# Altium schematic symbol library jlcpcb_2025_04_capacitors_extended_0603.schlib: 3668 symbols (part 15 of 20) (continued)
## GCJ188R71E153KA01D
designator C?  Capacitance: 15nF  (hidden comment: *)
Capacitor, Ceramic (MLCC), 15nF, ±10%, ±10%, SMD 0603; Manufacturer: Murata Electronics; Manufacturer Part Number: GCJ188R71E153KA01D; Package Size: 0603; JLCPCB Basic Part: No; JLCPCB Part Number: C883603; Supplier 1: LCSC; Category: Capacitors - MLCC; Supplier Part Number 1: C883603; Tolerance: ±10%; RoHS: Yes; ComponentLink1Description: Datasheet; ComponentLink1URL: https://wmsc.lcsc.com/wmsc/upload/file/pdf/v2/lcsc/2304140030_Murata-Electronics-GCJ188R71E153KA01D_C883603.pdf; ComponentLink2Description: JLCPCB Part URL; ComponentLink2URL: https://jlcpcb.com/partdetail/C883603; ComponentLink3Description: LCSC Part URL; ComponentLink3URL: https://lcsc.com/product-detail/Multilayer-Ceramic-Capacitors-MLCC---SMD-SMT_Murata-Electronics-Murata-Electronics-GCJ188R71E153KA01D_C883603.html
footprint CAP-0603 (0603 (1608M) Capacitor)
pins: 1, 2

## GCJ188R71E224KA12D
designator C?  Capacitance: 220nF  (hidden comment: *)
Capacitor, Ceramic (MLCC), 220nF, ±10%, 25V, X7R, ±10%, SMD 0603; Manufacturer: Murata Electronics; Manufacturer Part Number: GCJ188R71E224KA12D; Package Size: 0603; JLCPCB Basic Part: No; JLCPCB Part Number: C441745; Supplier 1: LCSC; Category: Capacitors - MLCC; Supplier Part Number 1: C441745; Tolerance: ±10%; Voltage Rating: 25V; Temperature Coefficient: X7R; RoHS: Yes; ComponentLink1Description: Datasheet; ComponentLink1URL: https://wmsc.lcsc.com/wmsc/upload/file/pdf/v2/lcsc/2304140030_Murata-Electronics-GCJ188R71E224KA12D_C441745.pdf; ComponentLink2Description: JLCPCB Part URL; ComponentLink2URL: https://jlcpcb.com/partdetail/C441745; ComponentLink3Description: LCSC Part URL; ComponentLink3URL: https://lcsc.com/product-detail/Multilayer-Ceramic-Capacitors-MLCC---SMD-SMT_Murata-Electronics-Murata-Electronics-GCJ188R71E224KA12D_C441745.html
footprint CAP-0603 (0603 (1608M) Capacitor)
pins: 1, 2

## GCJ188R71E473KA01D
designator C?  Capacitance: 47nF  (hidden comment: *)
Capacitor, Ceramic (MLCC), 47nF, ±10%, 25V, X7R, ±10%, SMD 0603; Manufacturer: Murata Electronics; Manufacturer Part Number: GCJ188R71E473KA01D; Package Size: 0603; JLCPCB Basic Part: No; JLCPCB Part Number: C354390; Supplier 1: LCSC; Category: Capacitors - MLCC; Supplier Part Number 1: C354390; Tolerance: ±10%; Voltage Rating: 25V; Temperature Coefficient: X7R; RoHS: Yes; ComponentLink1Description: Datasheet; ComponentLink1URL: https://wmsc.lcsc.com/wmsc/upload/file/pdf/v2/lcsc/1912111437_Murata-Electronics-GCJ188R71E473KA01D_C354390.pdf; ComponentLink2Description: JLCPCB Part URL; ComponentLink2URL: https://jlcpcb.com/partdetail/C354390; ComponentLink3Description: LCSC Part URL; ComponentLink3URL: https://lcsc.com/product-detail/Multilayer-Ceramic-Capacitors-MLCC---SMD-SMT_Murata-Electronics-Murata-Electronics-GCJ188R71E473KA01D_C354390.html
footprint CAP-0603 (0603 (1608M) Capacitor)
pins: 1, 2

## GCJ188R71H102KA01D
designator C?  Capacitance: 1nF  (hidden comment: *)
Capacitor, Ceramic (MLCC), 1nF, ±10%, 50V, X7R, ±10%, SMD 0603; Manufacturer: Murata Electronics; Manufacturer Part Number: GCJ188R71H102KA01D; Package Size: 0603; JLCPCB Basic Part: No; JLCPCB Part Number: C161114; Supplier 1: LCSC; Category: Capacitors - MLCC; Supplier Part Number 1: C161114; Tolerance: ±10%; Voltage Rating: 50V; Temperature Coefficient: X7R; RoHS: Yes; ComponentLink1Description: Datasheet; ComponentLink1URL: https://wmsc.lcsc.com/wmsc/upload/file/pdf/v2/lcsc/1810311127_Murata-Electronics-GCJ188R71H102KA01D_C161114.pdf; ComponentLink2Description: JLCPCB Part URL; ComponentLink2URL: https://jlcpcb.com/partdetail/C161114; ComponentLink3Description: LCSC Part URL; ComponentLink3URL: https://lcsc.com/product-detail/Multilayer-Ceramic-Capacitors-MLCC---SMD-SMT_Murata-Electronics-Murata-Electronics-GCJ188R71H102KA01D_C161114.html
footprint CAP-0603 (0603 (1608M) Capacitor)
pins: 1, 2

## GCJ188R71H104KA12D
designator C?  Capacitance: 100nF  (hidden comment: *)
Capacitor, Ceramic (MLCC), 100nF, ±10%, 50V, X7R, ±10%, SMD 0603; Manufacturer: Murata Electronics; Manufacturer Part Number: GCJ188R71H104KA12D; Package Size: 0603; JLCPCB Basic Part: No; JLCPCB Part Number: C161115; Supplier 1: LCSC; Category: Capacitors - MLCC; Supplier Part Number 1: C161115; Tolerance: ±10%; Voltage Rating: 50V; Temperature Coefficient: X7R; RoHS: Yes; ComponentLink1Description: Datasheet; ComponentLink1URL: https://wmsc.lcsc.com/wmsc/upload/file/pdf/v2/lcsc/1810311134_Murata-Electronics-GCJ188R71H104KA12D_C161115.pdf; ComponentLink2Description: JLCPCB Part URL; ComponentLink2URL: https://jlcpcb.com/partdetail/C161115; ComponentLink3Description: LCSC Part URL; ComponentLink3URL: https://lcsc.com/product-detail/Multilayer-Ceramic-Capacitors-MLCC---SMD-SMT_Murata-Electronics-Murata-Electronics-GCJ188R71H104KA12D_C161115.html
footprint CAP-0603 (0603 (1608M) Capacitor)
pins: 1, 2

## GCJ188R71H153KA01D
designator C?  Capacitance: 15nF  (hidden comment: *)
Capacitor, Ceramic (MLCC), 15nF, ±10%, null, ±10%, SMD 0603; Manufacturer: Murata Electronics; Manufacturer Part Number: GCJ188R71H153KA01D; Package Size: 0603; JLCPCB Basic Part: No; JLCPCB Part Number: C913495; Supplier 1: LCSC; Category: Capacitors - MLCC; Supplier Part Number 1: C913495; Tolerance: ±10%; Voltage Rating: null; RoHS: Yes; ComponentLink1Description: Datasheet; ComponentLink1URL: https://wmsc.lcsc.com/wmsc/upload/file/pdf/v2/lcsc/2304140030_Murata-Electronics-GCJ188R71H153KA01D_C913495.pdf; ComponentLink2Description: JLCPCB Part URL; ComponentLink2URL: https://jlcpcb.com/partdetail/C913495; ComponentLink3Description: LCSC Part URL; ComponentLink3URL: https://lcsc.com/product-detail/Multilayer-Ceramic-Capacitors-MLCC---SMD-SMT_Murata-Electronics-Murata-Electronics-GCJ188R71H153KA01D_C913495.html
footprint CAP-0603 (0603 (1608M) Capacitor)
pins: 1, 2

## GCJ188R71H154KA01D
designator C?  Capacitance: 150nF  (hidden comment: *)
Capacitor, Ceramic (MLCC), 150nF, ±10%, 50V, X7R, ±10%, SMD 0603; Manufacturer: Murata Electronics; Manufacturer Part Number: GCJ188R71H154KA01D; Package Size: 0603; JLCPCB Basic Part: No; JLCPCB Part Number: C437420; Supplier 1: LCSC; Category: Capacitors - MLCC; Supplier Part Number 1: C437420; Tolerance: ±10%; Voltage Rating: 50V; Temperature Coefficient: X7R; RoHS: Yes; ComponentLink1Description: Datasheet; ComponentLink1URL: https://wmsc.lcsc.com/wmsc/upload/file/pdf/v2/lcsc/1912141433_Murata-Electronics-GCJ188R71H154KA01D_C437420.pdf; ComponentLink2Description: JLCPCB Part URL; ComponentLink2URL: https://jlcpcb.com/partdetail/C437420; ComponentLink3Description: LCSC Part URL; ComponentLink3URL: https://lcsc.com/product-detail/Multilayer-Ceramic-Capacitors-MLCC---SMD-SMT_Murata-Electronics-Murata-Electronics-GCJ188R71H154KA01D_C437420.html
footprint CAP-0603 (0603 (1608M) Capacitor)
pins: 1, 2

## GCJ188R71H222KA01D
designator C?  Capacitance: 2.2nF  (hidden comment: *)
Capacitor, Ceramic (MLCC), 2.2nF, ±10%, 50V, X7R, ±10%, SMD 0603; Manufacturer: Murata Electronics; Manufacturer Part Number: GCJ188R71H222KA01D; Package Size: 0603; JLCPCB Basic Part: No; JLCPCB Part Number: C710620; Supplier 1: LCSC; Category: Capacitors - MLCC; Supplier Part Number 1: C710620; Tolerance: ±10%; Voltage Rating: 50V; Temperature Coefficient: X7R; RoHS: Yes; ComponentLink1Description: Datasheet; ComponentLink1URL: https://wmsc.lcsc.com/wmsc/upload/file/pdf/v2/lcsc/2210190600_Murata-Electronics-GCJ188R71H222KA01D_C710620.pdf; ComponentLink2Description: JLCPCB Part URL; ComponentLink2URL: https://jlcpcb.com/partdetail/C710620; ComponentLink3Description: LCSC Part URL; ComponentLink3URL: https://lcsc.com/product-detail/Multilayer-Ceramic-Capacitors-MLCC---SMD-SMT_Murata-Electronics-Murata-Electronics-GCJ188R71H222KA01D_C710620.html
footprint CAP-0603 (0603 (1608M) Capacitor)
pins: 1, 2

## GCJ188R71H223KA01D
designator C?  Capacitance: 22nF  (hidden comment: *)
Capacitor, Ceramic (MLCC), 22nF, ±10%, 50V, X7R, ±10%, SMD 0603; Manufacturer: Murata Electronics; Manufacturer Part Number: GCJ188R71H223KA01D; Package Size: 0603; JLCPCB Basic Part: No; JLCPCB Part Number: C161116; Supplier 1: LCSC; Category: Capacitors - MLCC; Supplier Part Number 1: C161116; Tolerance: ±10%; Voltage Rating: 50V; Temperature Coefficient: X7R; RoHS: Yes; ComponentLink1Description: Datasheet; ComponentLink1URL: https://wmsc.lcsc.com/wmsc/upload/file/pdf/v2/lcsc/1810092141_Murata-Electronics-GCJ188R71H223KA01D_C161116.pdf; ComponentLink2Description: JLCPCB Part URL; ComponentLink2URL: https://jlcpcb.com/partdetail/C161116; ComponentLink3Description: LCSC Part URL; ComponentLink3URL: https://lcsc.com/product-detail/Multilayer-Ceramic-Capacitors-MLCC---SMD-SMT_Murata-Electronics-Murata-Electronics-GCJ188R71H223KA01D_C161116.html
footprint CAP-0603 (0603 (1608M) Capacitor)
pins: 1, 2

## GCJ188R71H224KA01D
designator C?  Capacitance: 220nF  (hidden comment: *)
Capacitor, Ceramic (MLCC), 220nF, ±10%, 50V, X7R, ±10%, SMD 0603; Manufacturer: Murata Electronics; Manufacturer Part Number: GCJ188R71H224KA01D; Package Size: 0603; JLCPCB Basic Part: No; JLCPCB Part Number: C354388; Supplier 1: LCSC; Category: Capacitors - MLCC; Supplier Part Number 1: C354388; Tolerance: ±10%; Voltage Rating: 50V; Temperature Coefficient: X7R; RoHS: Yes; ComponentLink1Description: Datasheet; ComponentLink1URL: https://wmsc.lcsc.com/wmsc/upload/file/pdf/v2/lcsc/1912111437_Murata-Electronics-GCJ188R71H224KA01D_C354388.pdf; ComponentLink2Description: JLCPCB Part URL; ComponentLink2URL: https://jlcpcb.com/partdetail/C354388; ComponentLink3Description: LCSC Part URL; ComponentLink3URL: https://lcsc.com/product-detail/Multilayer-Ceramic-Capacitors-MLCC---SMD-SMT_Murata-Electronics-Murata-Electronics-GCJ188R71H224KA01D_C354388.html
footprint CAP-0603 (0603 (1608M) Capacitor)
pins: 1, 2

## GCJ188R71H272KA01D
designator C?  Capacitance: 2.7nF  (hidden comment: *)
Capacitor, Ceramic (MLCC), 2.7nF, ±10%, 50V, X7R, ±10%, SMD 0603; Manufacturer: Murata Electronics; Manufacturer Part Number: GCJ188R71H272KA01D; Package Size: 0603; JLCPCB Basic Part: No; JLCPCB Part Number: C2986277; Supplier 1: LCSC; Category: Capacitors - MLCC; Supplier Part Number 1: C2986277; Tolerance: ±10%; Voltage Rating: 50V; Temperature Coefficient: X7R; RoHS: Yes; ComponentLink1Description: Datasheet; ComponentLink1URL: https://wmsc.lcsc.com/wmsc/upload/file/pdf/v2/lcsc/2205121145_Murata-Electronics-GCJ188R71H272KA01D_C2986277.pdf; ComponentLink2Description: JLCPCB Part URL; ComponentLink2URL: https://jlcpcb.com/partdetail/C2986277; ComponentLink3Description: LCSC Part URL; ComponentLink3URL: https://lcsc.com/product-detail/Multilayer-Ceramic-Capacitors-MLCC---SMD-SMT_Murata-Electronics-Murata-Electronics-GCJ188R71H272KA01D_C2986277.html
footprint CAP-0603 (0603 (1608M) Capacitor)
pins: 1, 2

## GCJ188R71H333KA12D
designator C?  Capacitance: 33nF  (hidden comment: *)
Capacitor, Ceramic (MLCC), 33nF, ±10%, 50V, X7R, ±10%, SMD 0603; Manufacturer: Murata Electronics; Manufacturer Part Number: GCJ188R71H333KA12D; Package Size: 0603; JLCPCB Basic Part: No; JLCPCB Part Number: C2173059; Supplier 1: LCSC; Category: Capacitors - MLCC; Supplier Part Number 1: C2173059; Tolerance: ±10%; Voltage Rating: 50V; Temperature Coefficient: X7R; RoHS: Yes; ComponentLink1Description: Datasheet; ComponentLink1URL: https://wmsc.lcsc.com/wmsc/upload/file/pdf/v2/lcsc/2308111554_Murata-Electronics-GCJ188R71H333KA12D_C2173059.pdf; ComponentLink2Description: JLCPCB Part URL; ComponentLink2URL: https://jlcpcb.com/partdetail/C2173059; ComponentLink3Description: LCSC Part URL; ComponentLink3URL: https://lcsc.com/product-detail/Multilayer-Ceramic-Capacitors-MLCC---SMD-SMT_Murata-Electronics-Murata-Electronics-GCJ188R71H333KA12D_C2173059.html
footprint CAP-0603 (0603 (1608M) Capacitor)
pins: 1, 2

## GCJ188R71H472KA01D
designator C?  Capacitance: 4.7nF  (hidden comment: *)
Capacitor, Ceramic (MLCC), 4.7nF, ±10%, 50V, X7R, ±10%, SMD 0603; Manufacturer: Murata Electronics; Manufacturer Part Number: GCJ188R71H472KA01D; Package Size: 0603; JLCPCB Basic Part: No; JLCPCB Part Number: C354387; Supplier 1: LCSC; Category: Capacitors - MLCC; Supplier Part Number 1: C354387; Tolerance: ±10%; Voltage Rating: 50V; Temperature Coefficient: X7R; RoHS: Yes; ComponentLink1Description: Datasheet; ComponentLink1URL: https://wmsc.lcsc.com/wmsc/upload/file/pdf/v2/lcsc/1912111437_Murata-Electronics-GCJ188R71H472KA01D_C354387.pdf; ComponentLink2Description: JLCPCB Part URL; ComponentLink2URL: https://jlcpcb.com/partdetail/C354387; ComponentLink3Description: LCSC Part URL; ComponentLink3URL: https://lcsc.com/product-detail/Multilayer-Ceramic-Capacitors-MLCC---SMD-SMT_Murata-Electronics-Murata-Electronics-GCJ188R71H472KA01D_C354387.html
footprint CAP-0603 (0603 (1608M) Capacitor)
pins: 1, 2

## GCJ188R71H473KA12D
designator C?  Capacitance: 47nF  (hidden comment: *)
Capacitor, Ceramic (MLCC), 47nF, ±10%, 50V, X7R, ±10%, SMD 0603; Manufacturer: Murata Electronics; Manufacturer Part Number: GCJ188R71H473KA12D; Package Size: 0603; JLCPCB Basic Part: No; JLCPCB Part Number: C354386; Supplier 1: LCSC; Category: Capacitors - MLCC; Supplier Part Number 1: C354386; Tolerance: ±10%; Voltage Rating: 50V; Temperature Coefficient: X7R; RoHS: Yes; ComponentLink1Description: Datasheet; ComponentLink1URL: https://wmsc.lcsc.com/wmsc/upload/file/pdf/v2/lcsc/1912111437_Murata-Electronics-GCJ188R71H473KA12D_C354386.pdf; ComponentLink2Description: JLCPCB Part URL; ComponentLink2URL: https://jlcpcb.com/partdetail/C354386; ComponentLink3Description: LCSC Part URL; ComponentLink3URL: https://lcsc.com/product-detail/Multilayer-Ceramic-Capacitors-MLCC---SMD-SMT_Murata-Electronics-Murata-Electronics-GCJ188R71H473KA12D_C354386.html
footprint CAP-0603 (0603 (1608M) Capacitor)
pins: 1, 2

## GCJ188R72A102KA01D
designator C?  Capacitance: 1nF  (hidden comment: *)
Capacitor, Ceramic (MLCC), 1nF, ±10%, 100V, X7R, ±10%, SMD 0603; Manufacturer: Murata Electronics; Manufacturer Part Number: GCJ188R72A102KA01D; Package Size: 0603; JLCPCB Basic Part: No; JLCPCB Part Number: C354384; Supplier 1: LCSC; Category: Capacitors - MLCC; Supplier Part Number 1: C354384; Tolerance: ±10%; Voltage Rating: 100V; Temperature Coefficient: X7R; RoHS: Yes; ComponentLink1Description: Datasheet; ComponentLink1URL: https://wmsc.lcsc.com/wmsc/upload/file/pdf/v2/lcsc/1912111437_Murata-Electronics-GCJ188R72A102KA01D_C354384.pdf; ComponentLink2Description: JLCPCB Part URL; ComponentLink2URL: https://jlcpcb.com/partdetail/C354384; ComponentLink3Description: LCSC Part URL; ComponentLink3URL: https://lcsc.com/product-detail/Multilayer-Ceramic-Capacitors-MLCC---SMD-SMT_Murata-Electronics-Murata-Electronics-GCJ188R72A102KA01D_C354384.html
footprint CAP-0603 (0603 (1608M) Capacitor)
pins: 1, 2

## GCJ188R72A103KA01D
designator C?  Capacitance: 10nF  (hidden comment: *)
Capacitor, Ceramic (MLCC), 10nF, ±10%, 100V, X7R, ±10%, SMD 0603; Manufacturer: Murata Electronics; Manufacturer Part Number: GCJ188R72A103KA01D; Package Size: 0603; JLCPCB Basic Part: No; JLCPCB Part Number: C354383; Supplier 1: LCSC; Category: Capacitors - MLCC; Supplier Part Number 1: C354383; Tolerance: ±10%; Voltage Rating: 100V; Temperature Coefficient: X7R; RoHS: Yes; ComponentLink1Description: Datasheet; ComponentLink1URL: https://wmsc.lcsc.com/wmsc/upload/file/pdf/v2/lcsc/1912111437_Murata-Electronics-GCJ188R72A103KA01D_C354383.pdf; ComponentLink2Description: JLCPCB Part URL; ComponentLink2URL: https://jlcpcb.com/partdetail/C354383; ComponentLink3Description: LCSC Part URL; ComponentLink3URL: https://lcsc.com/product-detail/Multilayer-Ceramic-Capacitors-MLCC---SMD-SMT_Murata-Electronics-Murata-Electronics-GCJ188R72A103KA01D_C354383.html
footprint CAP-0603 (0603 (1608M) Capacitor)
pins: 1, 2

## GCJ188R72A104KA01D
designator C?  Capacitance: 100nF  (hidden comment: *)
Capacitor, Ceramic (MLCC), 100nF, ±10%, 100V, X7R, ±10%, SMD 0603; Manufacturer: Murata Electronics; Manufacturer Part Number: GCJ188R72A104KA01D; Package Size: 0603; JLCPCB Basic Part: No; JLCPCB Part Number: C161117; Supplier 1: LCSC; Category: Capacitors - MLCC; Supplier Part Number 1: C161117; Tolerance: ±10%; Voltage Rating: 100V; Temperature Coefficient: X7R; RoHS: Yes; ComponentLink1Description: Datasheet; ComponentLink1URL: https://wmsc.lcsc.com/wmsc/upload/file/pdf/v2/lcsc/1810311134_Murata-Electronics-GCJ188R72A104KA01D_C161117.pdf; ComponentLink2Description: JLCPCB Part URL; ComponentLink2URL: https://jlcpcb.com/partdetail/C161117; ComponentLink3Description: LCSC Part URL; ComponentLink3URL: https://lcsc.com/product-detail/Multilayer-Ceramic-Capacitors-MLCC---SMD-SMT_Murata-Electronics-Murata-Electronics-GCJ188R72A104KA01D_C161117.html
footprint CAP-0603 (0603 (1608M) Capacitor)
pins: 1, 2

## GCJ188R72A223KA01D
designator C?  Capacitance: 22nF  (hidden comment: *)
Capacitor, Ceramic (MLCC), 22nF, ±10%, 100V, X7R, ±10%, SMD 0603; Manufacturer: Murata Electronics; Manufacturer Part Number: GCJ188R72A223KA01D; Package Size: 0603; JLCPCB Basic Part: No; JLCPCB Part Number: C408547; Supplier 1: LCSC; Category: Capacitors - MLCC; Supplier Part Number 1: C408547; Tolerance: ±10%; Voltage Rating: 100V; Temperature Coefficient: X7R; RoHS: Yes; ComponentLink1Description: Datasheet; ComponentLink1URL: https://wmsc.lcsc.com/wmsc/upload/file/pdf/v2/lcsc/1912111437_Murata-Electronics-GCJ188R72A223KA01D_C408547.pdf; ComponentLink2Description: JLCPCB Part URL; ComponentLink2URL: https://jlcpcb.com/partdetail/C408547; ComponentLink3Description: LCSC Part URL; ComponentLink3URL: https://lcsc.com/product-detail/Multilayer-Ceramic-Capacitors-MLCC---SMD-SMT_Murata-Electronics-Murata-Electronics-GCJ188R72A223KA01D_C408547.html
footprint CAP-0603 (0603 (1608M) Capacitor)
pins: 1, 2

## GCJ188R72A472KA01D
designator C?  Capacitance: 4.7nF  (hidden comment: *)
Capacitor, Ceramic (MLCC), 4.7nF, ±10%, 100V, X7R, ±10%, SMD 0603; Manufacturer: Murata Electronics; Manufacturer Part Number: GCJ188R72A472KA01D; Package Size: 0603; JLCPCB Basic Part: No; JLCPCB Part Number: C415392; Supplier 1: LCSC; Category: Capacitors - MLCC; Supplier Part Number 1: C415392; Tolerance: ±10%; Voltage Rating: 100V; Temperature Coefficient: X7R; RoHS: Yes; ComponentLink1Description: Datasheet; ComponentLink1URL: https://wmsc.lcsc.com/wmsc/upload/file/pdf/v2/lcsc/2304140030_Murata-Electronics-GCJ188R72A472KA01D_C415392.pdf; ComponentLink2Description: JLCPCB Part URL; ComponentLink2URL: https://jlcpcb.com/partdetail/C415392; ComponentLink3Description: LCSC Part URL; ComponentLink3URL: https://lcsc.com/product-detail/Multilayer-Ceramic-Capacitors-MLCC---SMD-SMT_Murata-Electronics-Murata-Electronics-GCJ188R72A472KA01D_C415392.html
footprint CAP-0603 (0603 (1608M) Capacitor)
pins: 1, 2

## GCJ188R72A682KA01D
designator C?  Capacitance: 6.8nF  (hidden comment: *)
Capacitor, Ceramic (MLCC), 6.8nF, ±10%, 100V, X7R, ±10%, SMD 0603; Manufacturer: Murata Electronics; Manufacturer Part Number: GCJ188R72A682KA01D; Package Size: 0603; JLCPCB Basic Part: No; JLCPCB Part Number: C2211098; Supplier 1: LCSC; Category: Capacitors - MLCC; Supplier Part Number 1: C2211098; Tolerance: ±10%; Voltage Rating: 100V; Temperature Coefficient: X7R; RoHS: Yes; ComponentLink1Description: Datasheet; ComponentLink1URL: https://wmsc.lcsc.com/wmsc/upload/file/pdf/v2/lcsc/2308111555_Murata-Electronics-GCJ188R72A682KA01D_C2211098.pdf; ComponentLink2Description: JLCPCB Part URL; ComponentLink2URL: https://jlcpcb.com/partdetail/C2211098; ComponentLink3Description: LCSC Part URL; ComponentLink3URL: https://lcsc.com/product-detail/Multilayer-Ceramic-Capacitors-MLCC---SMD-SMT_Murata-Electronics-Murata-Electronics-GCJ188R72A682KA01D_C2211098.html
footprint CAP-0603 (0603 (1608M) Capacitor)
pins: 1, 2

## GCJ188R91E334KA01D
designator C?  Capacitance: 330nF  (hidden comment: *)
Capacitor, Ceramic (MLCC), 330nF, ±10%, 25V, X8R, ±10%, SMD 0603; Manufacturer: Murata Electronics; Manufacturer Part Number: GCJ188R91E334KA01D; Package Size: 0603; JLCPCB Basic Part: No; JLCPCB Part Number: C354382; Supplier 1: LCSC; Category: Capacitors - MLCC; Supplier Part Number 1: C354382; Tolerance: ±10%; Voltage Rating: 25V; Temperature Coefficient: X8R; RoHS: Yes; ComponentLink1Description: Datasheet; ComponentLink1URL: https://wmsc.lcsc.com/wmsc/upload/file/pdf/v2/lcsc/1912111437_Murata-Electronics-GCJ188R91E334KA01D_C354382.pdf; ComponentLink2Description: JLCPCB Part URL; ComponentLink2URL: https://jlcpcb.com/partdetail/C354382; ComponentLink3Description: LCSC Part URL; ComponentLink3URL: https://lcsc.com/product-detail/Multilayer-Ceramic-Capacitors-MLCC---SMD-SMT_Murata-Electronics-Murata-Electronics-GCJ188R91E334KA01D_C354382.html
footprint CAP-0603 (0603 (1608M) Capacitor)
pins: 1, 2

## GCJ188R91E474KA01D
designator C?  Capacitance: 470nF  (hidden comment: *)
Capacitor, Ceramic (MLCC), 470nF, ±10%, 25V, X8R, ±10%, SMD 0603; Manufacturer: Murata Electronics; Manufacturer Part Number: GCJ188R91E474KA01D; Package Size: 0603; JLCPCB Basic Part: No; JLCPCB Part Number: C710622; Supplier 1: LCSC; Category: Capacitors - MLCC; Supplier Part Number 1: C710622; Tolerance: ±10%; Voltage Rating: 25V; Temperature Coefficient: X8R; RoHS: Yes; ComponentLink1Description: Datasheet; ComponentLink1URL: https://wmsc.lcsc.com/wmsc/upload/file/pdf/v2/lcsc/2210190600_Murata-Electronics-GCJ188R91E474KA01D_C710622.pdf; ComponentLink2Description: JLCPCB Part URL; ComponentLink2URL: https://jlcpcb.com/partdetail/C710622; ComponentLink3Description: LCSC Part URL; ComponentLink3URL: https://lcsc.com/product-detail/Multilayer-Ceramic-Capacitors-MLCC---SMD-SMT_Murata-Electronics-Murata-Electronics-GCJ188R91E474KA01D_C710622.html
footprint CAP-0603 (0603 (1608M) Capacitor)
pins: 1, 2

## GCJ188R91H104KA01D
designator C?  Capacitance: 100nF  (hidden comment: *)
Capacitor, Ceramic (MLCC), 100nF, ±10%, null, ±10%, SMD 0603; Manufacturer: Murata Electronics; Manufacturer Part Number: GCJ188R91H104KA01D; Package Size: 0603; JLCPCB Basic Part: No; JLCPCB Part Number: C437421; Supplier 1: LCSC; Category: Capacitors - MLCC; Supplier Part Number 1: C437421; Tolerance: ±10%; Voltage Rating: null; RoHS: Yes; ComponentLink1Description: Datasheet; ComponentLink1URL: https://wmsc.lcsc.com/wmsc/upload/file/pdf/v2/lcsc/2009121206_Murata-Electronics-GCJ188R91H104KA01D_C437421.pdf; ComponentLink2Description: JLCPCB Part URL; ComponentLink2URL: https://jlcpcb.com/partdetail/C437421; ComponentLink3Description: LCSC Part URL; ComponentLink3URL: https://lcsc.com/product-detail/Multilayer-Ceramic-Capacitors-MLCC---SMD-SMT_Murata-Electronics-Murata-Electronics-GCJ188R91H104KA01D_C437421.html
footprint CAP-0603 (0603 (1608M) Capacitor)
pins: 1, 2

## GCJ188R91H224KA01D
designator C?  Capacitance: 220nF  (hidden comment: *)
Capacitor, Ceramic (MLCC), 220nF, ±10%, 50V, X8R, ±10%, SMD 0603; Manufacturer: Murata Electronics; Manufacturer Part Number: GCJ188R91H224KA01D; Package Size: 0603; JLCPCB Basic Part: No; JLCPCB Part Number: C437422; Supplier 1: LCSC; Category: Capacitors - MLCC; Supplier Part Number 1: C437422; Tolerance: ±10%; Voltage Rating: 50V; Temperature Coefficient: X8R; RoHS: Yes; ComponentLink1Description: Datasheet; ComponentLink1URL: https://wmsc.lcsc.com/wmsc/upload/file/pdf/v2/lcsc/2007231103_Murata-Electronics-GCJ188R91H224KA01D_C437422.pdf; ComponentLink2Description: JLCPCB Part URL; ComponentLink2URL: https://jlcpcb.com/partdetail/C437422; ComponentLink3Description: LCSC Part URL; ComponentLink3URL: https://lcsc.com/product-detail/Multilayer-Ceramic-Capacitors-MLCC---SMD-SMT_Murata-Electronics-Murata-Electronics-GCJ188R91H224KA01D_C437422.html
footprint CAP-0603 (0603 (1608M) Capacitor)
pins: 1, 2

## GCJ188R92A103KA01D
designator C?  Capacitance: 10nF  (hidden comment: *)
Capacitor, Ceramic (MLCC), 10nF, ±10%, 100V, X8R, ±10%, SMD 0603; Manufacturer: Murata Electronics; Manufacturer Part Number: GCJ188R92A103KA01D; Package Size: 0603; JLCPCB Basic Part: No; JLCPCB Part Number: C1864332; Supplier 1: LCSC; Category: Capacitors - MLCC; Supplier Part Number 1: C1864332; Tolerance: ±10%; Voltage Rating: 100V; Temperature Coefficient: X8R; RoHS: Yes; ComponentLink1Description: Datasheet; ComponentLink1URL: https://wmsc.lcsc.com/wmsc/upload/file/pdf/v2/lcsc/2108030330_Murata-Electronics-GCJ188R92A103KA01D_C1864332.pdf; ComponentLink2Description: JLCPCB Part URL; ComponentLink2URL: https://jlcpcb.com/partdetail/C1864332; ComponentLink3Description: LCSC Part URL; ComponentLink3URL: https://lcsc.com/product-detail/Multilayer-Ceramic-Capacitors-MLCC---SMD-SMT_Murata-Electronics-Murata-Electronics-GCJ188R92A103KA01D_C1864332.html
footprint CAP-0603 (0603 (1608M) Capacitor)
pins: 1, 2

## GCJ188R92A473KA01D
designator C?  Capacitance: 47nF  (hidden comment: *)
Capacitor, Ceramic (MLCC), 47nF, ±10%, 100V, X8R, ±10%, SMD 0603; Manufacturer: Murata Electronics; Manufacturer Part Number: GCJ188R92A473KA01D; Package Size: 0603; JLCPCB Basic Part: No; JLCPCB Part Number: C354381; Supplier 1: LCSC; Category: Capacitors - MLCC; Supplier Part Number 1: C354381; Tolerance: ±10%; Voltage Rating: 100V; Temperature Coefficient: X8R; RoHS: Yes; ComponentLink1Description: Datasheet; ComponentLink1URL: https://wmsc.lcsc.com/wmsc/upload/file/pdf/v2/lcsc/1912111437_Murata-Electronics-GCJ188R92A473KA01D_C354381.pdf; ComponentLink2Description: JLCPCB Part URL; ComponentLink2URL: https://jlcpcb.com/partdetail/C354381; ComponentLink3Description: LCSC Part URL; ComponentLink3URL: https://lcsc.com/product-detail/Multilayer-Ceramic-Capacitors-MLCC---SMD-SMT_Murata-Electronics-Murata-Electronics-GCJ188R92A473KA01D_C354381.html
footprint CAP-0603 (0603 (1608M) Capacitor)
pins: 1, 2

## GCM188C71C684KA64D
designator C?  Capacitance: 680nF  (hidden comment: *)
Capacitor, Ceramic (MLCC), 680nF, ±10%, 16V, X7S, ±10%, SMD 0603; Manufacturer: Murata Electronics; Manufacturer Part Number: GCM188C71C684KA64D; Package Size: 0603; JLCPCB Basic Part: No; JLCPCB Part Number: C441738; Supplier 1: LCSC; Category: Capacitors - MLCC; Supplier Part Number 1: C441738; Tolerance: ±10%; Voltage Rating: 16V; Temperature Coefficient: X7S; RoHS: Yes; ComponentLink1Description: Datasheet; ComponentLink1URL: https://wmsc.lcsc.com/wmsc/upload/file/pdf/v2/lcsc/2304140030_Murata-Electronics-GCM188C71C684KA64D_C441738.pdf; ComponentLink2Description: JLCPCB Part URL; ComponentLink2URL: https://jlcpcb.com/partdetail/C441738; ComponentLink3Description: LCSC Part URL; ComponentLink3URL: https://lcsc.com/product-detail/Multilayer-Ceramic-Capacitors-MLCC---SMD-SMT_Murata-Electronics-Murata-Electronics-GCM188C71C684KA64D_C441738.html
footprint CAP-0603 (0603 (1608M) Capacitor)
pins: 1, 2

## GCM188D70J106ME36D
designator C?  Capacitance: 10uF  (hidden comment: *)
Capacitor, Ceramic (MLCC), 10uF, ±20%, 6.3V, X7T, ±20%, SMD 0603; Manufacturer: Murata Electronics; Manufacturer Part Number: GCM188D70J106ME36D; Package Size: 0603; JLCPCB Basic Part: No; JLCPCB Part Number: C3039641; Supplier 1: LCSC; Category: Capacitors - MLCC; Supplier Part Number 1: C3039641; Tolerance: ±20%; Voltage Rating: 6.3V; Temperature Coefficient: X7T; RoHS: Yes; ComponentLink1Description: Datasheet; ComponentLink1URL: https://wmsc.lcsc.com/wmsc/upload/file/pdf/v2/lcsc/2206171701_Murata-Electronics-GCM188D70J106ME36D_C3039641.pdf; ComponentLink2Description: JLCPCB Part URL; ComponentLink2URL: https://jlcpcb.com/partdetail/C3039641; ComponentLink3Description: LCSC Part URL; ComponentLink3URL: https://lcsc.com/product-detail/Multilayer-Ceramic-Capacitors-MLCC---SMD-SMT_Murata-Electronics-Murata-Electronics-GCM188D70J106ME36D_C3039641.html
footprint CAP-0603 (0603 (1608M) Capacitor)
pins: 1, 2

## GCM188L81C224MA37D
designator C?  Capacitance: 220nF  (hidden comment: *)
Capacitor, Ceramic (MLCC), 220nF, ±20%, 16V, X8L, ±20%, SMD 0603; Manufacturer: Murata Electronics; Manufacturer Part Number: GCM188L81C224MA37D; Package Size: 0603; JLCPCB Basic Part: No; JLCPCB Part Number: C2986290; Supplier 1: LCSC; Category: Capacitors - MLCC; Supplier Part Number 1: C2986290; Tolerance: ±20%; Voltage Rating: 16V; Temperature Coefficient: X8L; RoHS: Yes; ComponentLink1Description: Datasheet; ComponentLink1URL: https://wmsc.lcsc.com/wmsc/upload/file/pdf/v2/lcsc/2205121145_Murata-Electronics-GCM188L81C224MA37D_C2986290.pdf; ComponentLink2Description: JLCPCB Part URL; ComponentLink2URL: https://jlcpcb.com/partdetail/C2986290; ComponentLink3Description: LCSC Part URL; ComponentLink3URL: https://lcsc.com/product-detail/Multilayer-Ceramic-Capacitors-MLCC---SMD-SMT_Murata-Electronics-Murata-Electronics-GCM188L81C224MA37D_C2986290.html
footprint CAP-0603 (0603 (1608M) Capacitor)
pins: 1, 2

## GCM188L81H104KA57D
designator C?  Capacitance: 100nF  (hidden comment: *)
Capacitor, Ceramic (MLCC), 100nF, ±10%, 50V, X8L, ±10%, SMD 0603; Manufacturer: Murata Electronics; Manufacturer Part Number: GCM188L81H104KA57D; Package Size: 0603; JLCPCB Basic Part: No; JLCPCB Part Number: C161181; Supplier 1: LCSC; Category: Capacitors - MLCC; Supplier Part Number 1: C161181; Tolerance: ±10%; Voltage Rating: 50V; Temperature Coefficient: X8L; RoHS: Yes; ComponentLink1Description: Datasheet; ComponentLink1URL: https://wmsc.lcsc.com/wmsc/upload/file/pdf/v2/lcsc/1811142021_Murata-Electronics-GCM188L81H104KA57D_C161181.pdf; ComponentLink2Description: JLCPCB Part URL; ComponentLink2URL: https://jlcpcb.com/partdetail/C161181; ComponentLink3Description: LCSC Part URL; ComponentLink3URL: https://lcsc.com/product-detail/Multilayer-Ceramic-Capacitors-MLCC---SMD-SMT_Murata-Electronics-Murata-Electronics-GCM188L81H104KA57D_C161181.html
footprint CAP-0603 (0603 (1608M) Capacitor)
pins: 1, 2

## GCM188L81H393KA55D
designator C?  Capacitance: 39nF  (hidden comment: *)
Capacitor, Ceramic (MLCC), 39nF, ±10%, 50V, X8L, ±10%, SMD 0603; Manufacturer: Murata Electronics; Manufacturer Part Number: GCM188L81H393KA55D; Package Size: 0603; JLCPCB Basic Part: No; JLCPCB Part Number: C3856100; Supplier 1: LCSC; Category: Capacitors - MLCC; Supplier Part Number 1: C3856100; Tolerance: ±10%; Voltage Rating: 50V; Temperature Coefficient: X8L; RoHS: Yes; ComponentLink1Description: Datasheet; ComponentLink1URL: https://wmsc.lcsc.com/wmsc/upload/file/pdf/v2/lcsc/2308111430_Murata-Electronics-GCM188L81H393KA55D_C3856100.pdf; ComponentLink2Description: JLCPCB Part URL; ComponentLink2URL: https://jlcpcb.com/partdetail/C3856100; ComponentLink3Description: LCSC Part URL; ComponentLink3URL: https://lcsc.com/product-detail/Multilayer-Ceramic-Capacitors-MLCC---SMD-SMT_Murata-Electronics-Murata-Electronics-GCM188L81H393KA55D_C3856100.html
footprint CAP-0603 (0603 (1608M) Capacitor)
pins: 1, 2

## GCM188L81H473KA55D
designator C?  Capacitance: 47nF  (hidden comment: *)
Capacitor, Ceramic (MLCC), 47nF, ±10%, 50V, X8L, ±10%, SMD 0603; Manufacturer: Murata Electronics; Manufacturer Part Number: GCM188L81H473KA55D; Package Size: 0603; JLCPCB Basic Part: No; JLCPCB Part Number: C710682; Supplier 1: LCSC; Category: Capacitors - MLCC; Supplier Part Number 1: C710682; Tolerance: ±10%; Voltage Rating: 50V; Temperature Coefficient: X8L; RoHS: Yes; ComponentLink1Description: Datasheet; ComponentLink1URL: https://wmsc.lcsc.com/wmsc/upload/file/pdf/v2/lcsc/2304140030_Murata-Electronics-GCM188L81H473KA55D_C710682.pdf; ComponentLink2Description: JLCPCB Part URL; ComponentLink2URL: https://jlcpcb.com/partdetail/C710682; ComponentLink3Description: LCSC Part URL; ComponentLink3URL: https://lcsc.com/product-detail/Multilayer-Ceramic-Capacitors-MLCC---SMD-SMT_Murata-Electronics-Murata-Electronics-GCM188L81H473KA55D_C710682.html
footprint CAP-0603 (0603 (1608M) Capacitor)
pins: 1, 2

## GCM188R11H104KA42D
designator C?  Capacitance: 100nF  (hidden comment: *)
Capacitor, Ceramic (MLCC), 100nF, ±10%, ±10%, SMD 0603; Manufacturer: Murata Electronics; Manufacturer Part Number: GCM188R11H104KA42D; Package Size: 0603; JLCPCB Basic Part: No; JLCPCB Part Number: C913754; Supplier 1: LCSC; Category: Capacitors - MLCC; Supplier Part Number 1: C913754; Tolerance: ±10%; RoHS: Yes; ComponentLink1Description: Datasheet; ComponentLink1URL: https://wmsc.lcsc.com/wmsc/upload/file/pdf/v2/lcsc/2304140030_Murata-Electronics-GCM188R11H104KA42D_C913754.pdf; ComponentLink2Description: JLCPCB Part URL; ComponentLink2URL: https://jlcpcb.com/partdetail/C913754; ComponentLink3Description: LCSC Part URL; ComponentLink3URL: https://lcsc.com/product-detail/Multilayer-Ceramic-Capacitors-MLCC---SMD-SMT_Murata-Electronics-Murata-Electronics-GCM188R11H104KA42D_C913754.html
footprint CAP-0603 (0603 (1608M) Capacitor)
pins: 1, 2

## GCM188R11H222KA01D
designator C?  Capacitance: 2.2nF  (hidden comment: *)
Capacitor, Ceramic (MLCC), 2.2nF, ±10%, 50V, ±10%, SMD 0603; Manufacturer: Murata Electronics; Manufacturer Part Number: GCM188R11H222KA01D; Package Size: 0603; JLCPCB Basic Part: No; JLCPCB Part Number: C2980804; Supplier 1: LCSC; Category: Capacitors - MLCC; Supplier Part Number 1: C2980804; Tolerance: ±10%; Voltage Rating: 50V; RoHS: Yes; ComponentLink1Description: Datasheet; ComponentLink1URL: https://wmsc.lcsc.com/wmsc/upload/file/pdf/v2/lcsc/2203041730_Murata-Electronics-GCM188R11H222KA01D_C2980804.pdf; ComponentLink2Description: JLCPCB Part URL; ComponentLink2URL: https://jlcpcb.com/partdetail/C2980804; ComponentLink3Description: LCSC Part URL; ComponentLink3URL: https://lcsc.com/product-detail/Multilayer-Ceramic-Capacitors-MLCC---SMD-SMT_Murata-Electronics-Murata-Electronics-GCM188R11H222KA01D_C2980804.html
footprint CAP-0603 (0603 (1608M) Capacitor)
pins: 1, 2

## GCM188R70J225KE22D
designator C?  Capacitance: 2.2uF  (hidden comment: *)
Capacitor, Ceramic (MLCC), 2.2uF, ±10%, 6.3V, X7R, ±10%, SMD 0603; Manufacturer: Murata Electronics; Manufacturer Part Number: GCM188R70J225KE22D; Package Size: 0603; JLCPCB Basic Part: No; JLCPCB Part Number: C126582; Supplier 1: LCSC; Category: Capacitors - MLCC; Supplier Part Number 1: C126582; Tolerance: ±10%; Voltage Rating: 6.3V; Temperature Coefficient: X7R; RoHS: Yes; ComponentLink1Description: Datasheet; ComponentLink1URL: https://wmsc.lcsc.com/wmsc/upload/file/pdf/v2/lcsc/1810311130_Murata-Electronics-GCM188R70J225KE22D_C126582.pdf; ComponentLink2Description: JLCPCB Part URL; ComponentLink2URL: https://jlcpcb.com/partdetail/C126582; ComponentLink3Description: LCSC Part URL; ComponentLink3URL: https://lcsc.com/product-detail/Multilayer-Ceramic-Capacitors-MLCC---SMD-SMT_Murata-Electronics-Murata-Electronics-GCM188R70J225KE22D_C126582.html
footprint CAP-0603 (0603 (1608M) Capacitor)
pins: 1, 2

## GCM188R70J225KE22J
designator C?  Capacitance: 2.2uF  (hidden comment: *)
Capacitor, Ceramic (MLCC), 2.2uF, ±10%, 6.3V, X7R, ±10%, SMD 0603; Manufacturer: Murata Electronics; Manufacturer Part Number: GCM188R70J225KE22J; Package Size: 0603; JLCPCB Basic Part: No; JLCPCB Part Number: C2169526; Supplier 1: LCSC; Category: Capacitors - MLCC; Supplier Part Number 1: C2169526; Tolerance: ±10%; Voltage Rating: 6.3V; Temperature Coefficient: X7R; RoHS: Yes; ComponentLink1Description: Datasheet; ComponentLink1URL: https://wmsc.lcsc.com/wmsc/upload/file/pdf/v2/lcsc/2108051630_Murata-Electronics-GCM188R70J225KE22J_C2169526.pdf; ComponentLink2Description: JLCPCB Part URL; ComponentLink2URL: https://jlcpcb.com/partdetail/C2169526; ComponentLink3Description: LCSC Part URL; ComponentLink3URL: https://lcsc.com/product-detail/Multilayer-Ceramic-Capacitors-MLCC---SMD-SMT_Murata-Electronics-Murata-Electronics-GCM188R70J225KE22J_C2169526.html
footprint CAP-0603 (0603 (1608M) Capacitor)
pins: 1, 2

## GCM188R71C104KA37D
designator C?  Capacitance: 100nF  (hidden comment: *)
Capacitor, Ceramic (MLCC), 100nF, ±10%, 16V, X7R, ±10%, SMD 0603; Manufacturer: Murata Electronics; Manufacturer Part Number: GCM188R71C104KA37D; Package Size: 0603; JLCPCB Basic Part: No; JLCPCB Part Number: C184760; Supplier 1: LCSC; Category: Capacitors - MLCC; Supplier Part Number 1: C184760; Tolerance: ±10%; Voltage Rating: 16V; Temperature Coefficient: X7R; RoHS: Yes; ComponentLink1Description: Datasheet; ComponentLink1URL: https://wmsc.lcsc.com/wmsc/upload/file/pdf/v2/lcsc/1810311135_Murata-Electronics-GCM188R71C104KA37D_C184760.pdf; ComponentLink2Description: JLCPCB Part URL; ComponentLink2URL: https://jlcpcb.com/partdetail/C184760; ComponentLink3Description: LCSC Part URL; ComponentLink3URL: https://lcsc.com/product-detail/Multilayer-Ceramic-Capacitors-MLCC---SMD-SMT_Murata-Electronics-Murata-Electronics-GCM188R71C104KA37D_C184760.html
footprint CAP-0603 (0603 (1608M) Capacitor)
pins: 1, 2

## GCM188R71C105KA64D
designator C?  Capacitance: 1uF  (hidden comment: *)
Capacitor, Ceramic (MLCC), 1uF, ±10%, 16V, X7R, ±10%, SMD 0603; Manufacturer: Murata Electronics; Manufacturer Part Number: GCM188R71C105KA64D; Package Size: 0603; JLCPCB Basic Part: No; JLCPCB Part Number: C161212; Supplier 1: LCSC; Category: Capacitors - MLCC; Supplier Part Number 1: C161212; Tolerance: ±10%; Voltage Rating: 16V; Temperature Coefficient: X7R; RoHS: Yes; ComponentLink1Description: Datasheet; ComponentLink1URL: https://wmsc.lcsc.com/wmsc/upload/file/pdf/v2/lcsc/1912111437_Murata-Electronics-GCM188R71C105KA64D_C161212.pdf; ComponentLink2Description: JLCPCB Part URL; ComponentLink2URL: https://jlcpcb.com/partdetail/C161212; ComponentLink3Description: LCSC Part URL; ComponentLink3URL: https://lcsc.com/product-detail/Multilayer-Ceramic-Capacitors-MLCC---SMD-SMT_Murata-Electronics-Murata-Electronics-GCM188R71C105KA64D_C161212.html
footprint CAP-0603 (0603 (1608M) Capacitor)
pins: 1, 2

## GCM188R71C105KA64J
designator C?  Capacitance: 1uF  (hidden comment: *)
Capacitor, Ceramic (MLCC), 1uF, ±10%, 16V, ±10%, SMD 0603; Manufacturer: Murata Electronics; Manufacturer Part Number: GCM188R71C105KA64J; Package Size: 0603; JLCPCB Basic Part: No; JLCPCB Part Number: C2169902; Supplier 1: LCSC; Category: Capacitors - MLCC; Supplier Part Number 1: C2169902; Tolerance: ±10%; Voltage Rating: 16V; RoHS: Yes; ComponentLink1Description: Datasheet; ComponentLink1URL: https://wmsc.lcsc.com/wmsc/upload/file/pdf/v2/lcsc/2308111605_Murata-Electronics-GCM188R71C105KA64J_C2169902.pdf; ComponentLink2Description: JLCPCB Part URL; ComponentLink2URL: https://jlcpcb.com/partdetail/C2169902; ComponentLink3Description: LCSC Part URL; ComponentLink3URL: https://lcsc.com/product-detail/Multilayer-Ceramic-Capacitors-MLCC---SMD-SMT_Murata-Electronics-Murata-Electronics-GCM188R71C105KA64J_C2169902.html
footprint CAP-0603 (0603 (1608M) Capacitor)
pins: 1, 2

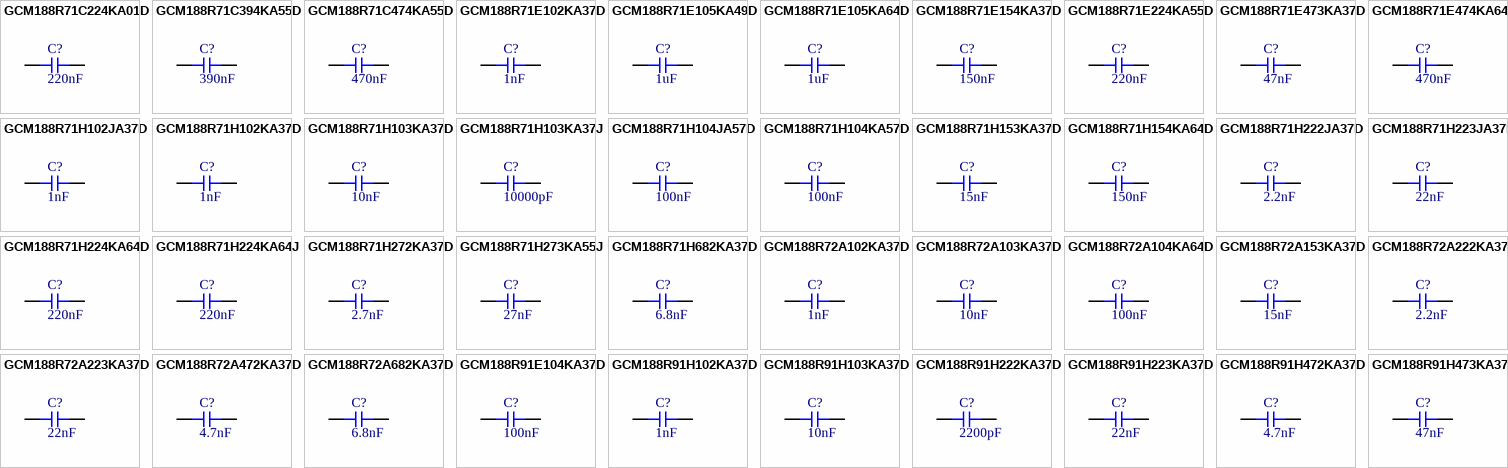
[diagram p68: symbols GCM188R71C224KA01D to GCM188R91H473KA37D]

## GCM188R71C224KA01D
designator C?  Capacitance: 220nF  (hidden comment: *)
Capacitor, Ceramic (MLCC), 220nF, ±10%, 16V, X7R, ±10%, SMD 0603; Manufacturer: Murata Electronics; Manufacturer Part Number: GCM188R71C224KA01D; Package Size: 0603; JLCPCB Basic Part: No; JLCPCB Part Number: C161213; Supplier 1: LCSC; Category: Capacitors - MLCC; Supplier Part Number 1: C161213; Tolerance: ±10%; Voltage Rating: 16V; Temperature Coefficient: X7R; RoHS: Yes; ComponentLink1Description: Datasheet; ComponentLink1URL: https://wmsc.lcsc.com/wmsc/upload/file/pdf/v2/lcsc/2304140030_Murata-Electronics-GCM188R71C224KA01D_C161213.pdf; ComponentLink2Description: JLCPCB Part URL; ComponentLink2URL: https://jlcpcb.com/partdetail/C161213; ComponentLink3Description: LCSC Part URL; ComponentLink3URL: https://lcsc.com/product-detail/Multilayer-Ceramic-Capacitors-MLCC---SMD-SMT_Murata-Electronics-Murata-Electronics-GCM188R71C224KA01D_C161213.html
footprint CAP-0603 (0603 (1608M) Capacitor)
pins: 1, 2

## GCM188R71C394KA55D
designator C?  Capacitance: 390nF  (hidden comment: *)
Capacitor, Ceramic (MLCC), 390nF, ±10%, 16V, X7R, ±10%, SMD 0603; Manufacturer: Murata Electronics; Manufacturer Part Number: GCM188R71C394KA55D; Package Size: 0603; JLCPCB Basic Part: No; JLCPCB Part Number: C437460; Supplier 1: LCSC; Category: Capacitors - MLCC; Supplier Part Number 1: C437460; Tolerance: ±10%; Voltage Rating: 16V; Temperature Coefficient: X7R; RoHS: Yes; ComponentLink1Description: Datasheet; ComponentLink1URL: https://wmsc.lcsc.com/wmsc/upload/file/pdf/v2/lcsc/2304140030_Murata-Electronics-GCM188R71C394KA55D_C437460.pdf; ComponentLink2Description: JLCPCB Part URL; ComponentLink2URL: https://jlcpcb.com/partdetail/C437460; ComponentLink3Description: LCSC Part URL; ComponentLink3URL: https://lcsc.com/product-detail/Multilayer-Ceramic-Capacitors-MLCC---SMD-SMT_Murata-Electronics-Murata-Electronics-GCM188R71C394KA55D_C437460.html
footprint CAP-0603 (0603 (1608M) Capacitor)
pins: 1, 2

## GCM188R71C474KA55D
designator C?  Capacitance: 470nF  (hidden comment: *)
Capacitor, Ceramic (MLCC), 470nF, ±10%, 16V, X7R, ±10%, SMD 0603; Manufacturer: Murata Electronics; Manufacturer Part Number: GCM188R71C474KA55D; Package Size: 0603; JLCPCB Basic Part: No; JLCPCB Part Number: C161214; Supplier 1: LCSC; Category: Capacitors - MLCC; Supplier Part Number 1: C161214; Tolerance: ±10%; Voltage Rating: 16V; Temperature Coefficient: X7R; RoHS: Yes; ComponentLink1Description: Datasheet; ComponentLink1URL: https://wmsc.lcsc.com/wmsc/upload/file/pdf/v2/lcsc/2304140030_Murata-Electronics-GCM188R71C474KA55D_C161214.pdf; ComponentLink2Description: JLCPCB Part URL; ComponentLink2URL: https://jlcpcb.com/partdetail/C161214; ComponentLink3Description: LCSC Part URL; ComponentLink3URL: https://lcsc.com/product-detail/Multilayer-Ceramic-Capacitors-MLCC---SMD-SMT_Murata-Electronics-Murata-Electronics-GCM188R71C474KA55D_C161214.html
footprint CAP-0603 (0603 (1608M) Capacitor)
pins: 1, 2

## GCM188R71E102KA37D
designator C?  Capacitance: 1nF  (hidden comment: *)
Capacitor, Ceramic (MLCC), 1nF, ±10%, 25V, X7R, ±10%, SMD 0603; Manufacturer: Murata Electronics; Manufacturer Part Number: GCM188R71E102KA37D; Package Size: 0603; JLCPCB Basic Part: No; JLCPCB Part Number: C408122; Supplier 1: LCSC; Category: Capacitors - MLCC; Supplier Part Number 1: C408122; Tolerance: ±10%; Voltage Rating: 25V; Temperature Coefficient: X7R; RoHS: Yes; ComponentLink1Description: Datasheet; ComponentLink1URL: https://wmsc.lcsc.com/wmsc/upload/file/pdf/v2/lcsc/2304140030_Murata-Electronics-GCM188R71E102KA37D_C408122.pdf; ComponentLink2Description: JLCPCB Part URL; ComponentLink2URL: https://jlcpcb.com/partdetail/C408122; ComponentLink3Description: LCSC Part URL; ComponentLink3URL: https://lcsc.com/product-detail/Multilayer-Ceramic-Capacitors-MLCC---SMD-SMT_Murata-Electronics-Murata-Electronics-GCM188R71E102KA37D_C408122.html
footprint CAP-0603 (0603 (1608M) Capacitor)
pins: 1, 2

## GCM188R71E105KA49D
designator C?  Capacitance: 1uF  (hidden comment: *)
Capacitor, Ceramic (MLCC), 1uF, ±10%, 25V, ±10%, SMD 0603; Manufacturer: Murata Electronics; Manufacturer Part Number: GCM188R71E105KA49D; Package Size: 0603; JLCPCB Basic Part: No; JLCPCB Part Number: C393692; Supplier 1: LCSC; Category: Capacitors - MLCC; Supplier Part Number 1: C393692; Tolerance: ±10%; Voltage Rating: 25V; RoHS: Yes; ComponentLink1Description: Datasheet; ComponentLink1URL: https://wmsc.lcsc.com/wmsc/upload/file/pdf/v2/lcsc/1912111437_Murata-Electronics-GCM188R71E105KA49D_C393692.pdf; ComponentLink2Description: JLCPCB Part URL; ComponentLink2URL: https://jlcpcb.com/partdetail/C393692; ComponentLink3Description: LCSC Part URL; ComponentLink3URL: https://lcsc.com/product-detail/Multilayer-Ceramic-Capacitors-MLCC---SMD-SMT_Murata-Electronics-Murata-Electronics-GCM188R71E105KA49D_C393692.html
footprint CAP-0603 (0603 (1608M) Capacitor)
pins: 1, 2

## GCM188R71E105KA64D
designator C?  Capacitance: 1uF  (hidden comment: *)
Capacitor, Ceramic (MLCC), 1uF, ±10%, 25V, X7R, ±10%, SMD 0603; Manufacturer: Murata Electronics; Manufacturer Part Number: GCM188R71E105KA64D; Package Size: 0603; JLCPCB Basic Part: No; JLCPCB Part Number: C85862; Supplier 1: LCSC; Category: Capacitors - MLCC; Supplier Part Number 1: C85862; Tolerance: ±10%; Voltage Rating: 25V; Temperature Coefficient: X7R; RoHS: Yes; ComponentLink1Description: Datasheet; ComponentLink1URL: https://wmsc.lcsc.com/wmsc/upload/file/pdf/v2/lcsc/2304140030_Murata-Electronics-GCM188R71E105KA64D_C85862.pdf; ComponentLink2Description: JLCPCB Part URL; ComponentLink2URL: https://jlcpcb.com/partdetail/C85862; ComponentLink3Description: LCSC Part URL; ComponentLink3URL: https://lcsc.com/product-detail/Multilayer-Ceramic-Capacitors-MLCC---SMD-SMT_Murata-Electronics-Murata-Electronics-GCM188R71E105KA64D_C85862.html
footprint CAP-0603 (0603 (1608M) Capacitor)
pins: 1, 2

## GCM188R71E154KA37D
designator C?  Capacitance: 150nF  (hidden comment: *)
Capacitor, Ceramic (MLCC), 150nF, ±10%, 25V, X7R, ±10%, SMD 0603; Manufacturer: Murata Electronics; Manufacturer Part Number: GCM188R71E154KA37D; Package Size: 0603; JLCPCB Basic Part: No; JLCPCB Part Number: C913573; Supplier 1: LCSC; Category: Capacitors - MLCC; Supplier Part Number 1: C913573; Tolerance: ±10%; Voltage Rating: 25V; Temperature Coefficient: X7R; RoHS: Yes; ComponentLink1Description: Datasheet; ComponentLink1URL: https://wmsc.lcsc.com/wmsc/upload/file/pdf/v2/lcsc/2304140030_Murata-Electronics-GCM188R71E154KA37D_C913573.pdf; ComponentLink2Description: JLCPCB Part URL; ComponentLink2URL: https://jlcpcb.com/partdetail/C913573; ComponentLink3Description: LCSC Part URL; ComponentLink3URL: https://lcsc.com/product-detail/Multilayer-Ceramic-Capacitors-MLCC---SMD-SMT_Murata-Electronics-Murata-Electronics-GCM188R71E154KA37D_C913573.html
footprint CAP-0603 (0603 (1608M) Capacitor)
pins: 1, 2

## GCM188R71E224KA55D
designator C?  Capacitance: 220nF  (hidden comment: *)
Capacitor, Ceramic (MLCC), 220nF, ±10%, 25V, X7R, ±10%, SMD 0603; Manufacturer: Murata Electronics; Manufacturer Part Number: GCM188R71E224KA55D; Package Size: 0603; JLCPCB Basic Part: No; JLCPCB Part Number: C161217; Supplier 1: LCSC; Category: Capacitors - MLCC; Supplier Part Number 1: C161217; Tolerance: ±10%; Voltage Rating: 25V; Temperature Coefficient: X7R; RoHS: Yes; ComponentLink1Description: Datasheet; ComponentLink1URL: https://wmsc.lcsc.com/wmsc/upload/file/pdf/v2/lcsc/1810311134_Murata-Electronics-GCM188R71E224KA55D_C161217.pdf; ComponentLink2Description: JLCPCB Part URL; ComponentLink2URL: https://jlcpcb.com/partdetail/C161217; ComponentLink3Description: LCSC Part URL; ComponentLink3URL: https://lcsc.com/product-detail/Multilayer-Ceramic-Capacitors-MLCC---SMD-SMT_Murata-Electronics-Murata-Electronics-GCM188R71E224KA55D_C161217.html
footprint CAP-0603 (0603 (1608M) Capacitor)
pins: 1, 2

## GCM188R71E473KA37D
designator C?  Capacitance: 47nF  (hidden comment: *)
Capacitor, Ceramic (MLCC), 47nF, ±10%, 25V, X7R, ±10%, SMD 0603; Manufacturer: Murata Electronics; Manufacturer Part Number: GCM188R71E473KA37D; Package Size: 0603; JLCPCB Basic Part: No; JLCPCB Part Number: C161218; Supplier 1: LCSC; Category: Capacitors - MLCC; Supplier Part Number 1: C161218; Tolerance: ±10%; Voltage Rating: 25V; Temperature Coefficient: X7R; RoHS: Yes; ComponentLink1Description: Datasheet; ComponentLink1URL: https://wmsc.lcsc.com/wmsc/upload/file/pdf/v2/lcsc/1810311133_Murata-Electronics-GCM188R71E473KA37D_C161218.pdf; ComponentLink2Description: JLCPCB Part URL; ComponentLink2URL: https://jlcpcb.com/partdetail/C161218; ComponentLink3Description: LCSC Part URL; ComponentLink3URL: https://lcsc.com/product-detail/Multilayer-Ceramic-Capacitors-MLCC---SMD-SMT_Murata-Electronics-Murata-Electronics-GCM188R71E473KA37D_C161218.html
footprint CAP-0603 (0603 (1608M) Capacitor)
pins: 1, 2
